# Altium footprint library HW_HOLLAND_NCDM_MONITOR_R1.PcbLib: 472 footprints (part 8 of 30)
Each footprint in its own frame and in the unit in brackets; x right, y up, seen from the top. Pads: shape width x height; smd on the part's side, far side on the other; paste and mask are expansions set on the pad; w line width, h text height; cw(c..) or ccw(c..) is an arc to the next point about the centre after c.
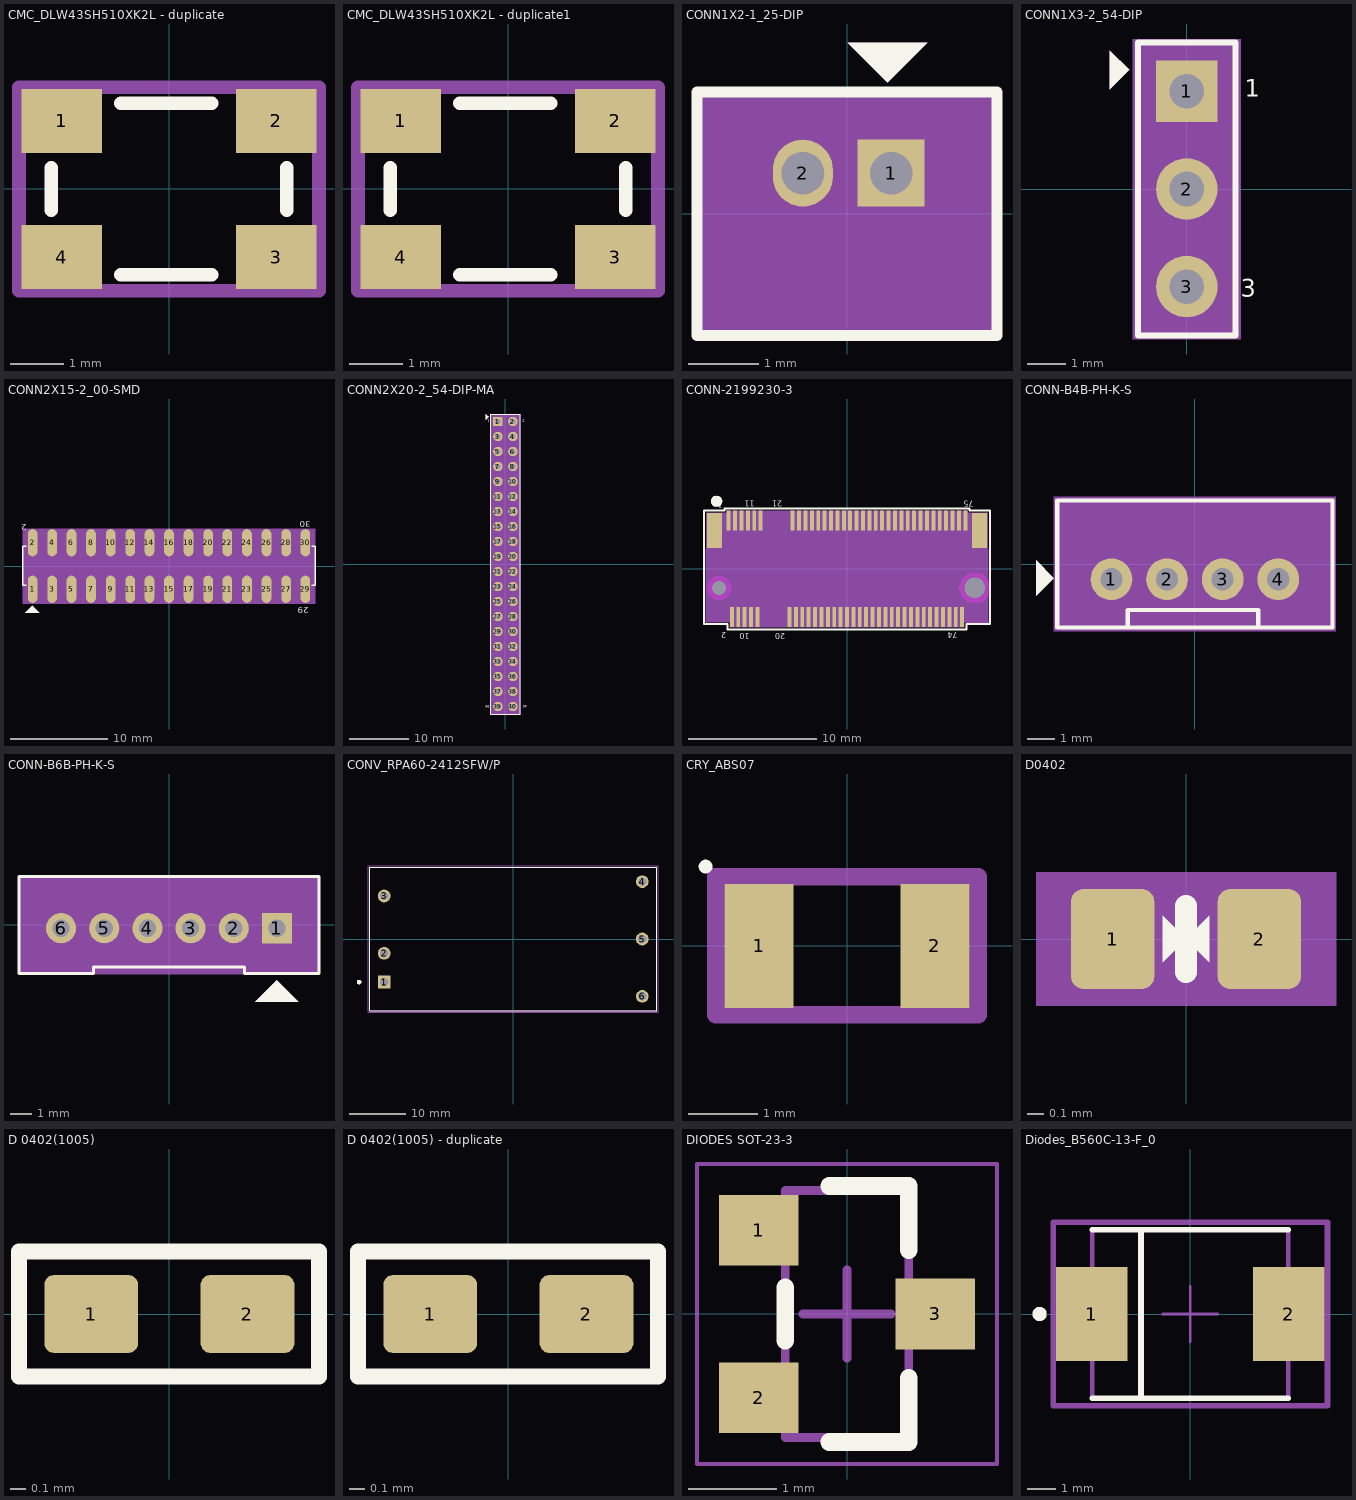
[diagram p7: the footprints below, top view; thin cyan lines are the x and y axes]

## CMC_DLW43SH510XK2L - duplicate [mm]
height 3.5
pads (4):
  rect 1.5x1.2 smd: 1(-2,1.27) 2(2,1.27) 3(2,-1.27) 4(-2,-1.27)
Top Overlay:
  lines w0.254: -2.2,-0.4 -2.2,0.4 ; -0.9,-1.6 0.8,-1.6 ; -0.9,1.6 0.8,1.6 ; 2.2,-0.4 2.2,0.4
Top Designator:
  lines w0.254: -2.8,-1.9 2.8,-1.9 2.8,1.9 -2.8,1.9 -2.8,-1.9
  text ".Designator" at -7.618,-0.508 h1.52
3D body "User Library-DLW43S.step": height 2.65, standoff 0.05, extent -2.25,-1.6 2.25,1.6

## CMC_DLW43SH510XK2L - duplicate1 [mm]
height 0.52
pads (4):
  rect 1.5x1.2 smd: 1(-2,1.27) 2(2,1.27) 3(2,-1.27) 4(-2,-1.27)
Top Overlay:
  lines w0.254: -2.2,-0.4 -2.2,0.4 ; -0.9,-1.6 0.8,-1.6 ; -0.9,1.6 0.8,1.6 ; 2.2,-0.4 2.2,0.4
Top Designator:
  lines w0.254: -2.8,-1.9 2.8,-1.9 2.8,1.9 -2.8,1.9 -2.8,-1.9
  text ".Designator" at -7.618,-0.508 h1.52
3D body "User Library-DLW43S.step": height 2.65, standoff 0.05, extent -2.25,-1.6 2.25,1.6

## CONN1X2-1_25-DIP [mm]
pads (2):
  rect 0.95x0.95 / inner round 0.95 / far side rect 0.95x0.95 hole 0.6: 1(0.625,0.575)
  oval 0.85x0.95 hole 0.6: 2(-0.625,0.575)
Top Overlay:
  dashed: 0.01,2.425 1.14,2.425 0.58,1.865 0.57,1.865
  lines w0.152: -2.125,-1.725 -2.125,1.725 2.125,1.725 2.125,-1.725 -2.125,-1.725
  text ".Designator" at 0.953,0.211 h0.64
Top Assembly:
  dashed: 0.01,2.425 1.14,2.425 0.58,1.865 0.57,1.865
  lines w0.025: -2.125,-1.725 -2.125,1.725 2.125,1.725 2.125,-1.725 -2.125,-1.725
Top 3D Body:
  region: -2.125,1.725 -2.125,-1.725 2.125,-1.725 2.125,1.725
Mechanical 17:
  text "1" at 1.226,0.265 h0.46
  text "2" at -0.054,0.335 h0.46
3D body: height 3.81, standoff 0, extent -2.125,-1.725 2.125,1.725

## CONN1X3-2_54-DIP [mm]
pads (3):
  rect 1.6x1.6 / inner round 1.6 / far side rect 1.6x1.6 hole 0.9: 1(0,2.54)
  round 1.6 hole 0.9: 2(0,0) 3(0,-2.54)
Top Overlay:
  dashed: -2,3.6 -2,2.6 -1.5,3.1
  lines w0.152: -1.27,-3.81 1.27,-3.81 1.27,3.81 -1.27,3.81 -1.27,-3.81
  text "1" at 1.502,2.4 h0.46
  text "3" at 1.402,-2.8 h0.46
Top Assembly:
  dashed: -2,3.6 -2,2.6 -1.5,3.1
  lines w0.025: -1.27,-3.81 -1.27,3.81 1.27,3.81 1.27,-3.81 -1.27,-3.81
  text ".Designator" at -0.953,-0.212 h0.64
Top 3D Body:
  region: -1.4,3.9 1.4,3.9 1.4,-3.9 -1.4,-3.9
Mechanical 17:
  text "1" at -0.183,2.4 h0.46
  text "2" at -0.711,-0.1 h1.78
  text "3" at -0.711,-2.7 h1.78
3D body: height 3.81, standoff 0, extent -1.4,-3.9 1.4,3.9

## CONN2X15-2_00-SMD [mil]
pads (30):
  oval 39x110 smd: 1(-551.15,-93.41) 2(-551.15,94.59) 3(-472.15,-93.41) 4(-472.15,94.59) 5(-394.15,-93.41) 6(-394.15,94.59) 7(-315.15,-93.41) 8(-315.15,94.59) 9(-236.15,-93.41) 10(-236.15,94.59) 11(-157.15,-93.41) 12(-157.15,94.59) 13(-79.15,-93.41) 14(-79.15,94.59) 15(-0.15,-93.41) 16(-0.15,94.59) 17(78.85,-93.41) 18(78.85,94.59) 19(157.85,-93.41) 20(157.85,94.59) 21(235.85,-93.41) 22(235.85,94.59) 23(314.85,-93.41) 24(314.85,94.59) 25(393.85,-93.41) 26(393.85,94.59) 27(472.85,-93.41) 28(472.85,94.59) 29(550.85,-93.41) 30(550.85,94.59)
Top Overlay:
  dashed: -551.94,-160.74 -579.94,-188.74 -523.94,-188.74
  lines w6: -575.98,-78.15 -590.55,-78.15 -590.55,79.33 -575.98,79.33 ; 575.59,-78.15 590.55,-78.15 590.55,79.33 575.59,79.33
  text "29" at 563.95,-166.11 h25
  text "30" at 571.55,180.99 h25
  text "2" at -575.25,168.49 h25
Top Assembly:
  dashed: -551.94,-160.74 -579.94,-188.74 -523.94,-188.74
  lines w1: -590.55,-78.15 590.55,-78.15 590.55,79.33 -590.55,79.33 -590.55,-78.15
  text ".Designator" at 25.01,8.32 h25
Top 3D Body:
  region: -590.55,150.98 -590.55,-150.98 590.55,-150.98 590.55,150.98
Mechanical 17:
  text "4" at -472.15,22.59 h90
  text "6" at -394.15,22.59 h90
  text "5" at -394.15,-165.41 h90
  text "14" at -79.15,-49.41 h90
  text "13" at -79.15,-237.41 h90
  text "26" at 393.85,-49.41 h90
  text "25" at 393.85,-237.41 h90
  text "15" at -0.15,-237.41 h90
  text "19" at 157.85,-237.41 h90
  text "2" at -551.15,22.59 h90
  text "1" at -551.15,-165.41 h90
  text "3" at -472.15,-165.41 h90
  text "20" at 157.85,-49.41 h90
  text "16" at -0.15,-49.41 h90
  text "27" at 472.85,-237.41 h90
  text "23" at 314.85,-237.41 h90
  text "28" at 472.85,-49.41 h90
  text "7" at -315.15,-165.41 h90
  text "11" at -157.15,-237.41 h90
  text "22" at 235.85,-49.41 h90
  text "10" at -236.15,-49.41 h90
  text "12" at -157.15,-49.41 h90
  text "30" at 550.85,-49.41 h90
  text "18" at 78.85,-49.41 h90
  text "9" at -236.15,-165.41 h90
  text "17" at 78.85,-237.41 h90
  text "8" at -315.15,22.59 h90
  text "29" at 550.85,-237.41 h90
  text "21" at 235.85,-237.41 h90
  text "24" at 314.85,-49.41 h90
3D body: height 150, standoff 0, extent -590.55,-150.98 590.55,150.98

## CONN2X20-2_54-DIP-MA [mm]
pads (40):
  rect 1.6x1.6 / inner round 1.6 / far side rect 1.6x1.6 hole 0.9: 1(-1.27,24.13)
  round 1.6 hole 0.9: 2(1.27,24.13) 3(-1.27,21.59) 4(1.27,21.59) 5(-1.27,19.05) 6(1.27,19.05) 7(-1.27,16.51) 8(1.27,16.51) 9(-1.27,13.97) 10(1.27,13.97) 11(-1.27,11.43) 12(1.27,11.43) 13(-1.27,8.89) 14(1.27,8.89) 15(-1.27,6.35) 16(1.27,6.35) 17(-1.27,3.81) 18(1.27,3.81) 19(-1.27,1.27) 20(1.27,1.27) 21(-1.27,-1.27) 22(1.27,-1.27) 23(-1.27,-3.81) 24(1.27,-3.81) 25(-1.27,-6.35) 26(1.27,-6.35) 27(-1.27,-8.89) 28(1.27,-8.89) 29(-1.27,-11.43) 30(1.27,-11.43) 31(-1.27,-13.97) 32(1.27,-13.97) 33(-1.27,-16.51) 34(1.27,-16.51) 35(-1.27,-19.05) 36(1.27,-19.05) 37(-1.27,-21.59) 38(1.27,-21.59) 39(-1.27,-24.13) 40(1.27,-24.13)
Top Overlay:
  dashed: -3.2,24.5 -2.8,24.9 -3.2,25.3 -3.3,25.4 -3.3,24.4
  lines w0.152: -2.5,-25.4 2.5,-25.4 2.5,25.4 -2.5,25.4 -2.5,-25.4
  text "1" at -2.643,24.405 h0.46
  text "2" at 3.257,24.405 h0.46
  text "39" at -2.675,-23.895 h0.46
  text "40" at 3.725,-23.895 h0.46
Top Assembly:
  dashed: -3.2,24.5 -2.8,24.9 -3.2,25.3 -3.3,25.4 -3.3,24.4
  lines w0.025: -2.5,-25.4 -2.5,25.4 2.5,25.4 2.5,-25.4 -2.5,-25.4
  text ".Designator" at 0.635,0.212 h0.64
Top 3D Body:
  region: -2.5,25.4 -2.5,-25.4 2.5,-25.4 2.5,25.4
Mechanical 17:
  text "37" at -1.27,-22.606 h1.27
  text "40" at 1.27,-25.146 h1.27
  text "10" at 1.27,12.954 h1.27
  text "36" at 1.27,-20.066 h1.27
  text "8" at 1.27,16.002 h1.27
  text "3" at -1.27,21.082 h1.27
  text "5" at -1.27,18.542 h1.27
  text "16" at 1.27,5.334 h1.27
  text "18" at 1.27,2.794 h1.27
  text "27" at -1.27,-9.906 h1.27
  text "28" at 1.27,-9.906 h1.27
  text "38" at 1.27,-22.606 h1.27
  text "7" at -1.27,16.002 h1.27
  text "29" at -1.27,-12.446 h1.27
  text "13" at -1.27,7.874 h1.27
  text "11" at -1.27,10.414 h1.27
  text "15" at -1.27,5.334 h1.27
  text "19" at -1.27,0.254 h1.27
  text "23" at -1.27,-4.826 h1.27
  text "21" at -1.27,-2.286 h1.27
  text "26" at 1.27,-7.366 h1.27
  text "35" at -1.27,-20.066 h1.27
  text "24" at 1.27,-4.826 h1.27
  text "32" at 1.27,-14.986 h1.27
  text "31" at -1.27,-14.986 h1.27
  text "33" at -1.27,-17.526 h1.27
  text "12" at 1.27,10.414 h1.27
  text "22" at 1.27,-2.286 h1.27
  text "34" at 1.27,-17.526 h1.27
  text "30" at 1.27,-12.446 h1.27
  text "20" at 1.27,0.254 h1.27
  text "14" at 1.27,7.874 h1.27
  text "6" at 1.27,18.542 h1.27
  text "39" at -1.27,-25.146 h1.27
  text "25" at -1.27,-7.366 h1.27
  text "9" at -1.27,13.462 h1.27
  text "2" at 1.27,23.622 h1.27
  text "4" at 1.27,21.082 h1.27
  text "1" at -1.27,23.947 h0.46
  text "17" at -1.27,2.794 h1.27
3D body: height 3.81, standoff 0, extent -2.5,-25.4 2.5,25.4

## CONN-2199230-3 [mil]
pads (71):
  rect 12x61 smd: 1(-364.17,148.62) 2(-354.33,-148.62) 3(-344.49,148.62) 4(-334.65,-148.62) 5(-324.8,148.62) 6(-314.96,-148.62) 7(-305.12,148.62) 8(-295.28,-148.62) 9(-285.43,148.62) 10(-275.59,-148.62) 11(-265.75,148.62) 20(-177.17,-148.62) 21(-167.32,148.62) 22(-157.48,-148.62) 23(-147.64,148.62) 24(-137.8,-148.62) 25(-127.95,148.62) 26(-118.11,-148.62) 27(-108.27,148.62) 28(-98.43,-148.62) 29(-88.58,148.62) 30(-78.74,-148.62) 31(-68.9,148.62) 32(-59.06,-148.62) 33(-49.21,148.62) 34(-39.37,-148.62) 35(-29.53,148.62) 36(-19.69,-148.62) 37(-9.84,148.62) 38(0,-148.62) 39(9.84,148.62) 40(19.69,-148.62) 41(29.53,148.62) 42(39.37,-148.62) 43(49.21,148.62) 44(59.06,-148.62) 45(68.9,148.62) 46(78.74,-148.62) 47(88.58,148.62) 48(98.43,-148.62) 49(108.27,148.62) 50(118.11,-148.62) 51(127.95,148.62) 52(137.8,-148.62) 53(147.64,148.62) 54(157.48,-148.62) 55(167.32,148.62) 56(177.17,-148.62) 57(187.01,148.62) 58(196.85,-148.62) 59(206.69,148.62) 60(216.54,-148.62) 61(226.38,148.62) 62(236.22,-148.62) 63(246.06,148.62) 64(255.91,-148.62) 65(265.75,148.62) 66(275.59,-148.62) 67(285.43,148.62) 68(295.28,-148.62) 69(305.12,148.62) 70(314.96,-148.62) 71(324.8,148.62) 72(334.65,-148.62) 73(344.49,148.62) 74(354.33,-148.62) 75(364.17,148.62)
  rect 47x108 smd: ""(-407.48,118.11) ""(407.48,118.11)
  round 10 hole 43 unplated: ""(-393.7,-59.05)
  round 10 hole 63 unplated: ""(393.7,-59.05)
Bottom Layer:
  region: 425.47,-59.05 424.39,-67.28 421.22,-74.94 416.17,-81.52 409.59,-86.57 401.92,-89.74 393.7,-90.82 385.48,-89.74 377.82,-86.57 371.24,-81.52 366.19,-74.94 363.01,-67.28 361.93,-59.05 363.01,-50.83 366.19,-43.17 371.24,-36.59 377.82,-31.54 385.48,-28.37 393.7,-27.28 401.92,-28.37 409.59,-31.54 416.17,-36.59 421.22,-43.17 424.39,-50.83
  region: -371.78,-59.05 -373.45,-67.44 -378.2,-74.56 -385.31,-79.31 -393.7,-80.98 -402.09,-79.31 -404.47,-77.71 -409.2,-74.56 -413.95,-67.44 -415.62,-59.05 -413.95,-50.66 -409.2,-43.55 -404.47,-40.39 -402.09,-38.8 -393.7,-37.13 -385.31,-38.8 -378.2,-43.55 -373.45,-50.66
Top Overlay:
  dashed: -383.5,207.7 -384.82,201.05 -388.58,195.41 -394.22,191.65 -400.87,190.32 -407.52,191.65 -409.41,192.91 -413.16,195.41 -416.92,201.05 -418.24,207.7 -416.92,214.35 -413.16,219.98 -409.41,222.49 -407.52,223.75 -400.87,225.07 -394.22,223.75 -388.58,219.98 -384.82,214.35
  lines w6: -440.07,-170.38 -440.07,179.11 -377.17,179.11 -377.17,186.12 377.17,186.12 377.17,179.11 440.07,179.11 440.07,-170.38 367.33,-170.38 367.33,-186.12 -367.33,-186.12 -367.33,-170.38 -440.07,-170.38
  text "20" at -189.4,-198.6 h18
  text "10" at -299.4,-198.6 h18
  text "21" at -199.4,210.08 h18
  text "11" at -284.4,210.08 h18
  text "2" at -372.2,-195.49 h18
  text "74" at 340.6,-194.92 h18
  text "75" at 390.6,210.08 h18
  text "1" at -382.2,205.08 h18
  text ".Designator" at 37.51,8.34 h25
Top Assembly:
  dashed: -383.42,207.68 -384.74,201.03 -388.5,195.4 -394.14,191.63 -400.79,190.31 -407.44,191.63 -409.32,192.89 -413.07,195.4 -416.84,201.03 -418.16,207.68 -416.84,214.33 -413.07,219.96 -409.32,222.46 -407.44,223.73 -400.79,225.05 -394.14,223.73 -388.5,219.96 -384.74,214.33
  lines w6: -433.32,-162.88 -365.35,-162.79 ; -433.07,-163.38 -433.07,59.25 ; -265.35,-163.98 -187.01,-163.98 ; -255.12,156.1 -175.98,156.1 ; 364.96,-163.58 433.22,-163.67 ; 433.07,-163.58 433.07,59.65
Top 3D Body:
  region: -360.33,-179.12 -360.33,-163.38 -433.07,-163.38 -433.07,172.11 -370.17,172.11 -370.17,179.12 370.17,179.12 370.17,172.11 433.07,172.11 433.07,-163.38 360.33,-163.38 360.33,-179.12
Top Component Center:
  lines w1: -10,-4.92 10,-4.92 ; 0,-14.92 0,5.08
Top Courtyard:
  dashed: -360.33,-179.12 -360.33,-163.38 -433.07,-163.38 -433.07,172.11 -370.17,172.11 -370.17,179.12 370.17,179.12 370.17,172.11 433.07,172.11 433.07,-163.38 360.33,-163.38 360.33,-179.12
Bottom Courtyard:
  dashed: 425.47,-59.05 424.39,-67.28 421.22,-74.94 416.17,-81.52 409.59,-86.57 401.92,-89.74 393.7,-90.82 385.48,-89.74 377.82,-86.57 371.24,-81.52 366.19,-74.94 363.01,-67.28 361.93,-59.05 363.01,-50.83 366.19,-43.17 371.24,-36.59 377.82,-31.54 385.48,-28.37 393.7,-27.28 401.92,-28.37 409.59,-31.54 416.17,-36.59 421.22,-43.17 424.39,-50.83
  dashed: -371.78,-59.05 -373.45,-67.44 -378.2,-74.56 -385.31,-79.31 -393.7,-80.98 -402.09,-79.31 -404.47,-77.71 -409.2,-74.56 -413.95,-67.44 -415.62,-59.05 -413.95,-50.66 -409.2,-43.55 -404.47,-40.39 -402.09,-38.8 -393.7,-37.13 -385.31,-38.8 -378.2,-43.55 -373.45,-50.66
Multi-Layer keep-out:
  region: -356.88,-59.05 -358.14,-68.58 -361.82,-77.46 -367.67,-85.09 -375.29,-90.94 -384.17,-94.62 -393.7,-95.87 -403.23,-94.62 -412.11,-90.94 -419.73,-85.09 -425.58,-77.46 -429.26,-68.58 -430.52,-59.05 -429.26,-49.53 -425.58,-40.65 -419.73,-33.02 -412.11,-27.17 -403.23,-23.49 -393.7,-22.24 -384.17,-23.49 -375.29,-27.17 -367.67,-33.02 -361.82,-40.65 -358.14,-49.53
  region: 440.6,-59.05 439,-71.19 434.32,-82.5 426.86,-92.22 417.15,-99.67 405.84,-104.36 393.7,-105.95 381.56,-104.36 370.25,-99.67 360.54,-92.22 353.08,-82.5 348.4,-71.19 346.8,-59.05 348.4,-46.92 353.08,-35.6 360.54,-25.89 370.25,-18.44 381.56,-13.75 393.7,-12.15 405.84,-13.75 417.15,-18.44 426.86,-25.89 434.32,-35.6 439,-46.92
Mechanical 17:
  text "10" at -294.79,-148.62 h24
  text "20" at -196.37,-148.62 h24
  text "22" at -176.68,-148.62 h24
  text "24" at -157,-148.62 h24
  text "26" at -137.31,-148.62 h24
  text "28" at -117.63,-148.62 h24
  text "29" at -107.78,148.62 h24
  text "31" at -88.1,148.62 h24
  text "35" at -48.73,148.62 h24
  text "37" at -29.04,148.62 h24
  text "41" at 10.33,148.62 h24
  text "43" at 30.01,148.62 h24
  text "47" at 69.38,148.62 h24
  text "49" at 89.07,148.62 h24
  text "50" at 98.91,-148.62 h24
  text "52" at 118.6,-148.62 h24
  text "53" at 128.44,148.62 h24
  text "54" at 138.28,-148.62 h24
  text "55" at 148.12,148.62 h24
  text "56" at 157.97,-148.62 h24
  text "58" at 177.65,-148.62 h24
  text "60" at 197.34,-148.62 h24
  text "62" at 217.02,-148.62 h24
  text "64" at 236.71,-148.62 h24
  text "48" at 79.23,-148.62 h24
  text "36" at -38.89,-148.62 h24
  text "6" at -324.56,-148.62 h24
  text "75" at 344.97,148.62 h24
  text "69" at 285.92,148.62 h24
  text "59" at 187.49,148.62 h24
  text "25" at -147.15,148.62 h24
  text "38" at -19.2,-148.62 h24
  text "68" at 276.08,-148.62 h24
  text "34" at -58.57,-148.62 h24
  text "67" at 266.23,148.62 h24
  text "7" at -314.72,148.62 h24
  text "44" at 39.86,-148.62 h24
  text "66" at 256.39,-148.62 h24
  text "30" at -97.94,-148.62 h24
  text "32" at -78.26,-148.62 h24
  text "40" at 0.49,-148.62 h24
  text "23" at -166.84,148.62 h24
  text "63" at 226.86,148.62 h24
  text "42" at 20.17,-148.62 h24
  text "46" at 59.54,-148.62 h24
  text "1" at -373.77,148.62 h24
  text "8" at -304.88,-148.62 h24
  text "21" at -186.52,148.62 h24
  text "65" at 246.55,148.62 h24
  text "61" at 207.18,148.62 h24
  text "9" at -295.03,148.62 h24
  text "2" at -363.93,-148.62 h24
  text "4" at -344.25,-148.62 h24
  text "70" at 295.76,-148.62 h24
  text "72" at 315.45,-148.62 h24
  text "74" at 335.13,-148.62 h24
  text "11" at -284.95,148.62 h24
  text "5" at -334.4,148.62 h24
  text "3" at -354.09,148.62 h24
  text "33" at -68.41,148.62 h24
  text "27" at -127.47,148.62 h24
  text "51" at 108.75,148.62 h24
  text "45" at 49.7,148.62 h24
  text "39" at -9.36,148.62 h24
  text "73" at 325.29,148.62 h24
  text "71" at 305.6,148.62 h24
  text "57" at 167.81,148.62 h24
3D body: height 150, standoff 0, extent -433.07,-179.12 433.07,179.12

## CONN-B4B-PH-K-S [mm]
pads (4):
  round 1.5 hole 0.8: 1(-3,-0.55) 2(-1,-0.55) 3(1,-0.55) 4(3,-0.55)
Top Overlay:
  dashed: -5.08,-0.508 -5.715,0.127 -5.715,-1.143
  lines w0.152: -2.413,-2.286 -2.413,-1.651 2.286,-1.651 2.286,-2.286 ; -4.953,-2.286 4.953,-2.286 4.953,2.286 -4.953,2.286 -4.953,-2.286
  text ".Designator" at -0.635,-0.212 h0.64
Top Assembly:
  lines w0.025: -5,-2.3 5,-2.3 5,2.3 -5,2.3 -5,-2.3
Top 3D Body:
  region: -5.08,2.413 5.08,2.413 5.08,-2.413 -5.08,-2.413
Mechanical 17:
  text "2" at -0.96,-0.438 h0.46
  text "3" at 1.08,-0.311 h0.46
  text "4" at 3.08,-0.311 h0.46
  text "1" at -3,-0.438 h0.46
3D body: height 3.81, standoff 0, extent -5.08,-2.413 5.08,2.413

## CONN-B6B-PH-K-S [mm]
pads (6):
  rect 1.4x1.4 / inner round 1.4 / far side rect 1.4x1.4 hole 0.8: 1(5,-0.15)
  round 1.4 hole 0.8: 2(3,-0.15) 3(1,-0.15) 4(-1,-0.15) 5(-3,-0.15) 6(-5,-0.15)
Top Overlay:
  dashed: 5,-2.55 4,-3.55 6,-3.55
  lines w0.127: -6.95,-2.25 -6.95,2.25 6.95,2.25 6.95,-2.25 3.5,-2.25 3.5,-1.95 -3.5,-1.95 -3.5,-2.25 -6.95,-2.25
  text ".Designator" at 0.953,0.212 h0.64
Top Assembly:
  dashed: 5,-2.55 4,-3.55 6,-3.55
  lines w0.025: -6.95,-2.25 -6.95,2.25 6.95,2.25 6.95,-2.25 -6.95,-2.25
Top 3D Body:
  region: 6.95,2.25 6.95,-2.25 -6.95,-2.25 -6.95,2.25
Mechanical 17:
  text "1" at 5.2,-0.706 h0.46
  text "5" at -2.8,-0.696 h0.46
  text "6" at -4.81,-0.726 h0.46
  text "3" at 1.17,-0.696 h0.46
  text "2" at 3.19,-0.736 h0.46
  text "4" at -0.81,-0.706 h0.46
3D body: height 3.81, standoff 0, extent -6.95,-2.25 6.95,2.25

## CONV_RPA60-2412SFW/P [mm]
pads (6):
  rect 2.25x2.25 hole 1.5: 1(-22.86,-7.62)
  round 2.25 hole 1.5: 2(-22.86,-2.54) 3(-22.86,7.62) 4(22.86,10.16) 5(22.86,0) 6(22.86,-10.16)
Top Overlay:
  circle w0.4: c-27.3,-7.62 r0.2
  lines w0.127: -25.4,-12.7 -25.4,12.7 25.4,12.7 25.4,-12.7 -25.4,-12.7
Mechanical 13:
  circle w0.4: c-27.3,-7.62 r0.2
  lines w0.127: -25.4,-12.7 -25.4,12.7 25.4,12.7 25.4,-12.7 -25.4,-12.7
Mechanical 15:
  lines w0.05: -25.65,-12.95 25.65,-12.95 25.65,12.95 -25.65,12.95 -25.65,-12.95
3D body "RPA60-2412SFW-P--3DModel-STEP-1.STEP": height 10.21, standoff -6.09, extent -25.4,-12.75 25.4,12.65

## CRY_ABS07 [mm]
pads (2):
  rect 1x1.8 smd: 1(-1.275,0) 2(1.275,0)
Top Overlay:
  circle w0.1: c-2.05,1.15 r0.05
Top Designator:
  lines w0.254: -1.9,-1 -1.9,1 1.9,1 1.9,-1 -1.9,-1
  text ".Designator" at 2.812,0.282 h1.25
3D body "User Library-ABS07.STEP": height 0.91, standoff 0, extent -1.61,-0.76 1.61,0.76

## D0402 [mm]
pads (2):
  rrect30% 0.499x0.6 smd: 1(-0.44,0) 2(0.44,0)
Top Overlay:
  dashed: 0,0 0.14,0.14 0.14,-0.14
  dashed: 0,0 -0.14,0.14 -0.14,-0.14
  lines w0.13: 0,-0.2 0,0.2
  text ".Designator" at -0.953,-0.212 h0.64
Top Assembly:
  lines w0.025: -0.86,-0.38 0.86,-0.38 0.86,0.38 -0.86,0.38 -0.86,-0.38
Top 3D Body:
  region: -0.9,0.4 0.9,0.4 0.9,-0.4 -0.9,-0.4
Top Component Outline:
  lines w0.025: 0.25,-0.25 0.25,0.25 -0.25,0.25 -0.25,-0.25 -0.5,-0.25 ; -0.5,-0.25 -0.5,0.25 ; -0.5,-0.25 0.5,-0.25 0.5,0.25 -0.5,0.25 ; -0.5,-0.25 -0.5,0.25
Mechanical 17:
  text "2" at 0.64,0.216 h0.46
  text "1" at -0.3,0.186 h0.46
3D body: height 3.81, standoff 0, extent -0.9,-0.4 0.9,0.4

## D 0402(1005) [mm]
pads (2):
  rrect25% 0.6x0.5 smd mask+0.102: 1(-0.5,0) 2(0.5,0)
Top Overlay:
  lines w0.1: -0.962,-0.4 -0.962,0.4 0.957,0.4 0.957,-0.4 -0.962,-0.4
3D body "TPD1E05U06DPYR.STEP": height 0.45, standoff 0, extent -0.5,-0.3 0.5,0.3

## D 0402(1005) - duplicate [mm]
pads (2):
  rrect25% 0.6x0.5 smd mask+0.102: 1(-0.5,0) 2(0.5,0)
Top Overlay:
  lines w0.1: -0.962,-0.4 -0.962,0.4 0.957,0.4 0.957,-0.4 -0.962,-0.4
3D body "TPD1E05U06DPYR.STEP": height 0.45, standoff 0, extent -0.5,-0.3 0.5,0.3

## DIODES SOT-23-3 [mm] "SOT23, 3-Leads, Body 2.90x2.40mm, Pitch 0.95mm, IPC Medium Density"
height 1.35
pads (3):
  rect 0.9x0.8 smd: 1(-1,0.95) 2(-1,-0.95) 3(1,0)
Top Overlay:
  lines w0.2: -0.7,-0.3 -0.7,0.3 ; -0.2,-1.45 0.7,-1.45 0.7,-0.725 ; -0.2,1.45 0.7,1.45 0.7,0.725
Mechanical 13:
  lines w0.1: -0.7,-1.4 0.7,-1.4 0.7,1.4 -0.7,1.4 -0.7,-1.4
Mechanical 15:
  lines w0.05: -1.7,-1.7 1.7,-1.7 1.7,1.7 -1.7,1.7 -1.7,-1.7
  lines w0.1: -0.5,0 0.5,0 ; 0,-0.5 0,0.5
3D body "sot-23-3.STEP": height 1.5, standoff 0, extent -1.41,-1.45 1.411,1.45

## Diodes_B560C-13-F_0 [mm]
pads (2):
  rect 2.5x3.3 smd paste+0 mask+0: 1(-3.45,0) 2(3.45,0)
Top Overlay:
  circle w0.25: c-5.275,0 r0.125
  lines w0.2: -3.427,-2.953 3.427,-2.953 ; -3.427,2.953 3.427,2.953 ; -1.725,-2.852 -1.725,2.852
Top Courtyard:
  lines w0.2: -4.8,-3.21 -4.8,3.21 4.8,3.21 4.8,-3.21 -4.8,-3.21
  text ".Designator" at 0,0 h1
Mechanical 12:
  lines w0.15: -3.427,-2.953 -3.427,2.953 3.427,2.953 3.427,-2.953 -3.427,-2.953
Mechanical 15:
  lines w0.1: -0.963,0 0.963,0 ; 0,-0.963 0,0.963
  lines w0.2: -4.8,-3.21 -4.8,3.21 4.8,3.21 4.8,-3.21 -4.8,-3.21
3D body "User Library-DO-214AB(SMC).STEP": height 2.67, standoff 0.03, extent -4.064,-3.15 4.064,3.15